# Altium footprint library 6-Connectors-2.PcbLib: 57 footprints (part 5 of 7) (continued)
## HARTING_09 03 796 6850 [mm] "DIN 41612, Type C, Thru-Hole Press-in Terminations; Rows a+b+c, 96 Position, Performance level 2, Lead 4.5mm, Pitch 2.54mm, Straight Female Backplane Connector With Coding"
height 11.6
pads (98):
  round 1.7 hole 1: a1(0,0) a2(0,-2.54) a3(0,-5.08) a4(0,-7.62) a5(0,-10.16) a6(0,-12.7) a7(0,-15.24) a8(0,-17.78) a9(0,-20.32) a10(0,-22.86) a11(0,-25.4) a12(0,-27.94) a13(0,-30.48) a14(0,-33.02) a15(0,-35.56) a16(0,-38.1) a17(0,-40.64) a18(0,-43.18) a19(0,-45.72) a20(0,-48.26) a21(0,-50.8) a22(0,-53.34) a23(0,-55.88) a24(0,-58.42) a25(0,-60.96) a26(0,-63.5) a27(0,-66.04) a28(0,-68.58) a29(0,-71.12) a30(0,-73.66) a31(0,-76.2) a32(0,-78.74) b1(2.54,0) b2(2.54,-2.54) b3(2.54,-5.08) b4(2.54,-7.62) b5(2.54,-10.16) b6(2.54,-12.7) b7(2.54,-15.24) b8(2.54,-17.78) b9(2.54,-20.32) b10(2.54,-22.86) b11(2.54,-25.4) b12(2.54,-27.94) b13(2.54,-30.48) b14(2.54,-33.02) b15(2.54,-35.56) b16(2.54,-38.1) b17(2.54,-40.64) b18(2.54,-43.18) b19(2.54,-45.72) b20(2.54,-48.26) b21(2.54,-50.8) b22(2.54,-53.34) b23(2.54,-55.88) b24(2.54,-58.42) b25(2.54,-60.96) b26(2.54,-63.5) b27(2.54,-66.04) b28(2.54,-68.58) b29(2.54,-71.12) b30(2.54,-73.66) b31(2.54,-76.2) b32(2.54,-78.74) c1(5.08,0) c2(5.08,-2.54) c3(5.08,-5.08) c4(5.08,-7.62) c5(5.08,-10.16) c6(5.08,-12.7) c7(5.08,-15.24) c8(5.08,-17.78) c9(5.08,-20.32) c10(5.08,-22.86) c11(5.08,-25.4) c12(5.08,-27.94) c13(5.08,-30.48) c14(5.08,-33.02) c15(5.08,-35.56) c16(5.08,-38.1) c17(5.08,-40.64) c18(5.08,-43.18) c19(5.08,-45.72) c20(5.08,-48.26) c21(5.08,-50.8) c22(5.08,-53.34) c23(5.08,-55.88) c24(5.08,-58.42) c25(5.08,-60.96) c26(5.08,-63.5) c27(5.08,-66.04) c28(5.08,-68.58) c29(5.08,-71.12) c30(5.08,-73.66) c31(5.08,-76.2) c32(5.08,-78.74)
  round 3.5 / inner round 3.5 / far side round 5.1 hole 2.8: MTG1(2.24,5.63) MTG2(2.24,-84.37)
Top Overlay:
  drawing of 160 lines, arcs and shapes, not listed
  text "a" at -1.951,3.96 h1.2
  text "c" at 5.305,2.935 h1.2
  text "10" at -5.475,-23.46 h1.2
  text "32" at -5.675,-79.365 h1.2
  text "5" at -4.55,-10.835 h1.2
  text "30" at -5.675,-74.285 h1.2
  text "25" at -5.675,-61.585 h1.2
  text "20" at -5.675,-48.885 h1.2
  text "15" at -5.475,-36.135 h1.2
  text "1" at -4.075,-0.675 h1.2
Mechanical 8:
  drawing of 396 lines, arcs and shapes, not listed
Mechanical 14:
  drawing of 1310 lines, arcs and shapes, not listed
  text "a" at -1.951,3.96 h1.2
  text "c" at 5.305,2.935 h1.2
  text "10" at -5.475,-23.46 h1.2
  text "32" at -5.675,-79.365 h1.2
  text "5" at -4.55,-10.835 h1.2
  text "30" at -5.675,-74.285 h1.2
  text "25" at -5.675,-61.585 h1.2
  text "20" at -5.675,-48.885 h1.2
  text "15" at -5.475,-36.135 h1.2
  text "1" at -4.075,-0.675 h1.2
Drill Drawing:
  lines w0.1: -2.54,-58.42 -2.54,-81.28 7.62,-81.28 7.62,2.54 -2.54,2.54 -2.54,-20.32
  text "PRESS-FIT TECHNOLOGY diam. 1mm +0.1 -0" at -1.905,-56.515 h1
3D body "HARTING_09 03 796 6850.stp": height 11.6, standoff -4.5, extent -2.71,-86.82 9.99,8.08

## HARTING_09 04 132 2921 [mm] "Eurocard DIN 41612, Type D, 32 Position, Rows a+c, Performance level 1, Male, Lead 3.0 mm, Pitch 5.08 mm"
height 11
pads (34):
  round 1.7 hole 1: a2(0,0) a4(0,-5.08) a6(0,-10.16) a8(0,-15.24) a10(0,-20.32) a12(0,-25.4) a14(0,-30.48) a16(0,-35.56) a18(0,-40.64) a20(0,-45.72) a22(0,-50.8) a24(0,-55.88) a26(0,-60.96) a28(0,-66.04) a30(0,-71.12) a32(0,-76.2) c2(-5.08,0) c4(-5.08,-5.08) c6(-5.08,-10.16) c8(-5.08,-15.24) c10(-5.08,-20.32) c12(-5.08,-25.4) c14(-5.08,-30.48) c16(-5.08,-35.56) c18(-5.08,-40.64) c20(-5.08,-45.72) c22(-5.08,-50.8) c24(-5.08,-55.88) c26(-5.08,-60.96) c28(-5.08,-66.04) c30(-5.08,-71.12) c32(-5.08,-76.2)
  round 3.5 / inner round 3.5 / far side round 5.1 hole 2.8: MTG1(2.54,7.62) MTG2(2.54,-81.28)
Top Overlay:
  lines w0.2: 1.65,-83.78 -0.31,-83.78 -0.31,-78.28 2.04,-78.28 ; 1.65,10.12 -0.31,10.12 -0.31,4.62 2.04,4.62 ; 2.04,-75.05 4.84,-75.05 ccw(c4.84,-74.85) 5.04,-74.85 5.04,-72.83 ccw(c4.84,-72.83) 4.84,-72.63 2.04,-72.63 ; 2.04,-71.43 4.84,-71.43 ccw(c4.84,-71.23) 5.04,-71.23 5.04,-67.63 ccw(c4.84,-67.63) 4.84,-67.43 2.04,-67.43 ; 2.04,-66.23 4.84,-66.23 ccw(c4.84,-66.03) 5.04,-66.03 5.04,-61.63 ccw(c4.84,-61.63) 4.84,-61.43 2.04,-61.43 ; 2.04,-60.23 4.84,-60.23 ccw(c4.84,-60.03) 5.04,-60.03 5.04,-55.63 ccw(c4.84,-55.63) 4.84,-55.43 2.04,-55.43 ; 2.04,-54.23 4.84,-54.23 ccw(c4.84,-54.03) 5.04,-54.03 5.04,-49.63 ccw(c4.84,-49.63) 4.84,-49.43 2.04,-49.43 ; 2.04,-48.23 4.84,-48.23 ccw(c4.84,-48.03) 5.04,-48.03 5.04,-43.63 ccw(c4.84,-43.63) 4.84,-43.43 2.04,-43.43 ; 2.04,-42.23 4.84,-42.23 ccw(c4.84,-42.03) 5.04,-42.03 5.04,-37.63 ccw(c4.84,-37.63) 4.84,-37.43 2.04,-37.43 ; 2.04,-36.23 4.84,-36.23 ccw(c4.84,-36.03) 5.04,-36.03 5.04,-31.63 ccw(c4.84,-31.63) 4.84,-31.43 2.04,-31.43 ; 2.04,-30.23 4.84,-30.23 ccw(c4.84,-30.03) 5.04,-30.03 5.04,-25.63 ccw(c4.84,-25.63) 4.84,-25.43 2.04,-25.43 ; 2.04,-24.23 4.84,-24.23 ccw(c4.84,-24.03) 5.04,-24.03 5.04,-19.63 ccw(c4.84,-19.63) 4.84,-19.43 2.04,-19.43 ; 2.04,-18.23 4.84,-18.23 ccw(c4.84,-18.03) 5.04,-18.03 5.04,-13.63 ccw(c4.84,-13.63) 4.84,-13.43 2.04,-13.43 ; 2.04,-12.23 4.84,-12.23 ccw(c4.84,-12.03) 5.04,-12.03 5.04,-7.63 ccw(c4.84,-7.63) 4.84,-7.43 2.04,-7.43 ; 2.04,-6.23 4.84,-6.23 ccw(c4.84,-6.03) 5.04,-6.03 5.04,-2.43 ccw(c4.84,-2.43) 4.84,-2.23 2.04,-2.23 ; 2.04,-1.03 4.84,-1.03 ccw(c4.84,-0.83) 5.04,-0.83 5.04,1.19 ccw(c4.84,1.19) 4.84,1.39 2.04,1.39 ; 2.04,3.69 4.84,3.69 ccw(c4.84,3.89) 5.04,3.89 5.04,6.75 ; 3.275,-83.78 7.74,-83.78 7.74,-80.53 ; 3.275,10.12 7.74,10.12 7.74,6.87 ; 2.04,-77.35 2.04,4.77 3.897,4.77 5.04,6.75 ; 2.04,-77.35 2.04,-77.55 2.04,-78.43 3.897,-78.43 5.04,-80.41 ; 2.04,-77.35 4.84,-77.35 cw(c4.84,-77.55) 5.04,-77.55 5.04,-80.41 ; 5.04,-80.41 5.109,-80.53 12.64,-80.53 12.64,6.87 5.109,6.87 5.04,6.75
  text "2" at -8.57,-0.675 h1.2
  text "4" at -8.57,-5.755 h1.2
  text "6" at -8.57,-10.835 h1.2
  text "8" at -8.57,-15.915 h1.2
  text "12" at -8.57,-26.075 h1.2
  text "14" at -8.57,-31.155 h1.2
  text "16" at -8.57,-36.235 h1.2
  text "18" at -8.57,-41.315 h1.2
  text "22" at -8.57,-51.475 h1.2
  text "24" at -8.57,-56.555 h1.2
  text "26" at -8.57,-61.635 h1.2
  text "c" at -4.445,1.905 h1.2
  text "a" at 0.635,1.905 h1.2
  text "32" at -8.57,-76.875 h1.2
  text "10" at -8.57,-20.995 h1.2
  text "20" at -8.57,-46.395 h1.2
  text "28" at -8.57,-66.715 h1.2
  text "30" at -8.57,-71.795 h1.2
Mechanical 8:
  lines w0.1: 5.3,-76.2 5.3,-40.475 ; 5.3,-35.725 5.3,0
  text "PCB" at 6.05,-40.1 h1.2
Mechanical 14:
  lines w0.1: 2.04,-78.28 -0.31,-78.28 -0.31,-83.78 7.74,-83.78 7.74,-80.53 ; 2.04,-75.05 4.84,-75.05 ccw(c4.84,-74.85) 5.04,-74.85 5.04,-72.83 ccw(c4.84,-72.83) 4.84,-72.63 2.04,-72.63 ; 2.04,-71.43 4.84,-71.43 ccw(c4.84,-71.23) 5.04,-71.23 5.04,-67.63 ccw(c4.84,-67.63) 4.84,-67.43 2.04,-67.43 ; 2.04,-66.23 4.84,-66.23 ccw(c4.84,-66.03) 5.04,-66.03 5.04,-61.63 ccw(c4.84,-61.63) 4.84,-61.43 2.04,-61.43 ; 2.04,-60.23 4.84,-60.23 ccw(c4.84,-60.03) 5.04,-60.03 5.04,-55.63 ccw(c4.84,-55.63) 4.84,-55.43 2.04,-55.43 ; 2.04,-54.23 4.84,-54.23 ccw(c4.84,-54.03) 5.04,-54.03 5.04,-49.63 ccw(c4.84,-49.63) 4.84,-49.43 2.04,-49.43 ; 2.04,-48.23 4.84,-48.23 ccw(c4.84,-48.03) 5.04,-48.03 5.04,-43.63 ccw(c4.84,-43.63) 4.84,-43.43 2.04,-43.43 ; 2.04,-42.23 4.84,-42.23 ccw(c4.84,-42.03) 5.04,-42.03 5.04,-37.63 ccw(c4.84,-37.63) 4.84,-37.43 2.04,-37.43 ; 2.04,-36.23 4.84,-36.23 ccw(c4.84,-36.03) 5.04,-36.03 5.04,-31.63 ccw(c4.84,-31.63) 4.84,-31.43 2.04,-31.43 ; 2.04,-30.23 4.84,-30.23 ccw(c4.84,-30.03) 5.04,-30.03 5.04,-25.63 ccw(c4.84,-25.63) 4.84,-25.43 2.04,-25.43 ; 2.04,-24.23 4.84,-24.23 ccw(c4.84,-24.03) 5.04,-24.03 5.04,-19.63 ccw(c4.84,-19.63) 4.84,-19.43 2.04,-19.43 ; 2.04,-18.23 4.84,-18.23 ccw(c4.84,-18.03) 5.04,-18.03 5.04,-13.63 ccw(c4.84,-13.63) 4.84,-13.43 2.04,-13.43 ; 2.04,-12.23 4.84,-12.23 ccw(c4.84,-12.03) 5.04,-12.03 5.04,-7.63 ccw(c4.84,-7.63) 4.84,-7.43 2.04,-7.43 ; 2.04,-6.23 4.84,-6.23 ccw(c4.84,-6.03) 5.04,-6.03 5.04,-2.43 ccw(c4.84,-2.43) 4.84,-2.23 2.04,-2.23 ; 2.04,-1.03 4.84,-1.03 ccw(c4.84,-0.83) 5.04,-0.83 5.04,1.19 ccw(c4.84,1.19) 4.84,1.39 2.04,1.39 ; 2.04,3.69 4.84,3.69 ccw(c4.84,3.89) 5.04,3.89 5.04,6.75 ; 2.04,4.62 -0.31,4.62 -0.31,10.12 7.74,10.12 7.74,6.87 ; 2.04,-77.35 4.84,-77.35 cw(c4.84,-77.55) 5.04,-77.55 5.04,-80.41 ; 2.04,-77.35 2.04,-77.55 2.04,-78.43 3.897,-78.43 5.04,-80.41 ; 2.04,-77.35 2.04,4.77 3.897,4.77 5.04,6.75 ; 5.04,-80.41 5.109,-80.53 12.64,-80.53 12.64,6.87 5.109,6.87 5.04,6.75
  text "a" at 0.635,1.905 h1.2
  text "c" at -4.445,1.905 h1.2
  text "30" at -8.57,-71.795 h1.2
  text "28" at -8.57,-66.715 h1.2
  text "20" at -8.57,-46.395 h1.2
  text "10" at -8.57,-20.995 h1.2
  text "32" at -8.57,-76.875 h1.2
  text "26" at -8.57,-61.635 h1.2
  text "24" at -8.57,-56.555 h1.2
  text "22" at -8.57,-51.475 h1.2
  text "18" at -8.57,-41.315 h1.2
  text "16" at -8.57,-36.235 h1.2
  text "14" at -8.57,-31.155 h1.2
  text "12" at -8.57,-26.075 h1.2
  text "8" at -8.57,-15.915 h1.2
  text "6" at -8.57,-10.835 h1.2
  text "4" at -8.57,-5.755 h1.2
  text "2" at -8.57,-0.675 h1.2
3D body "v160-080.stp": height 0.02, standoff -1.65, extent -5.88,-77 -4.28,-75.4
3D body "v160-080.stp": height 0.02, standoff -1.65, extent -0.8,-77 0.8,-75.4
3D body "v160-080.stp": height 0.02, standoff -1.65, extent -0.8,-71.92 0.8,-70.32
3D body "v160-080.stp": height 0.02, standoff -1.65, extent -0.8,-66.84 0.8,-65.24
3D body "v160-080.stp": height 0.02, standoff -1.65, extent -0.8,-61.76 0.8,-60.16
3D body "v160-080.stp": height 0.02, standoff -1.65, extent -5.88,-71.92 -4.28,-70.32
3D body "v160-080.stp": height 0.02, standoff -1.65, extent -5.88,-66.84 -4.28,-65.24
3D body "v160-080.stp": height 0.02, standoff -1.65, extent -5.88,-61.76 -4.28,-60.16
3D body "v160-080.stp": height 0.02, standoff -1.65, extent -0.8,-56.68 0.8,-55.08
3D body "v160-080.stp": height 0.02, standoff -1.65, extent -0.8,-51.6 0.8,-50
3D body "v160-080.stp": height 0.02, standoff -1.65, extent -0.8,-46.52 0.8,-44.92
3D body "v160-080.stp": height 0.02, standoff -1.65, extent -5.88,-56.68 -4.28,-55.08
3D body "v160-080.stp": height 0.02, standoff -1.65, extent -5.88,-51.6 -4.28,-50
3D body "v160-080.stp": height 0.02, standoff -1.65, extent -5.88,-46.52 -4.28,-44.92
3D body "v160-080.stp": height 0.02, standoff -1.65, extent -0.8,-41.44 0.8,-39.84
3D body "v160-080.stp": height 0.02, standoff -1.65, extent -0.8,-36.36 0.8,-34.76
3D body "v160-080.stp": height 0.02, standoff -1.65, extent -0.8,-31.28 0.8,-29.68
3D body "v160-080.stp": height 0.02, standoff -1.65, extent -5.88,-41.44 -4.28,-39.84
3D body "v160-080.stp": height 0.02, standoff -1.65, extent -5.88,-36.36 -4.28,-34.76
3D body "v160-080.stp": height 0.02, standoff -1.65, extent -5.88,-31.28 -4.28,-29.68
3D body "v160-080.stp": height 0.02, standoff -1.65, extent -0.8,-26.2 0.8,-24.6
3D body "v160-080.stp": height 0.02, standoff -1.65, extent -0.8,-21.12 0.8,-19.52
3D body "v160-080.stp": height 0.02, standoff -1.65, extent -0.8,-16.04 0.8,-14.44
3D body "v160-080.stp": height 0.02, standoff -1.65, extent -5.88,-26.2 -4.28,-24.6
3D body "v160-080.stp": height 0.02, standoff -1.65, extent -5.88,-21.12 -4.28,-19.52
3D body "v160-080.stp": height 0.02, standoff -1.65, extent -5.88,-16.04 -4.28,-14.44
3D body "v160-080.stp": height 0.02, standoff -1.65, extent -0.8,-10.96 0.8,-9.36
3D body "v160-080.stp": height 0.02, standoff -1.65, extent -0.8,-5.88 0.8,-4.28
3D body "v160-080.stp": height 0.02, standoff -1.65, extent -0.8,-0.8 0.8,0.8
3D body "v160-080.stp": height 0.02, standoff -1.65, extent -5.88,-10.96 -4.28,-9.36
3D body "v160-080.stp": height 0.02, standoff -1.65, extent -5.88,-5.88 -4.28,-4.28
3D body "v160-080.stp": height 0.02, standoff -1.65, extent -5.88,-0.8 -4.28,0.8
3D body "HARTING_09 04 132 2921.stp": height 9.4, standoff -3, extent -5.38,-83.83 12.64,10.17

## HARTING_09 04 132 6921 [mm] "Eurocard DIN 41612, Type D, 32 Position, Rows a+c, Performance level 2, Male, Lead 3.0 mm, Pitch 5.08 mm"
height 11
pads (34):
  round 1.7 hole 1: a2(0,0) a4(0,-5.08) a6(0,-10.16) a8(0,-15.24) a10(0,-20.32) a12(0,-25.4) a14(0,-30.48) a16(0,-35.56) a18(0,-40.64) a20(0,-45.72) a22(0,-50.8) a24(0,-55.88) a26(0,-60.96) a28(0,-66.04) a30(0,-71.12) a32(0,-76.2) c2(-5.08,0) c4(-5.08,-5.08) c6(-5.08,-10.16) c8(-5.08,-15.24) c10(-5.08,-20.32) c12(-5.08,-25.4) c14(-5.08,-30.48) c16(-5.08,-35.56) c18(-5.08,-40.64) c20(-5.08,-45.72) c22(-5.08,-50.8) c24(-5.08,-55.88) c26(-5.08,-60.96) c28(-5.08,-66.04) c30(-5.08,-71.12) c32(-5.08,-76.2)
  round 3.5 / inner round 3.5 / far side round 5.1 hole 2.8: MTG1(2.54,7.62) MTG2(2.54,-81.28)
Top Overlay:
  lines w0.2: 1.65,-83.78 -0.31,-83.78 -0.31,-78.28 2.04,-78.28 ; 1.65,10.12 -0.31,10.12 -0.31,4.62 2.04,4.62 ; 2.04,-75.05 4.84,-75.05 ccw(c4.84,-74.85) 5.04,-74.85 5.04,-72.83 ccw(c4.84,-72.83) 4.84,-72.63 2.04,-72.63 ; 2.04,-71.43 4.84,-71.43 ccw(c4.84,-71.23) 5.04,-71.23 5.04,-67.63 ccw(c4.84,-67.63) 4.84,-67.43 2.04,-67.43 ; 2.04,-66.23 4.84,-66.23 ccw(c4.84,-66.03) 5.04,-66.03 5.04,-61.63 ccw(c4.84,-61.63) 4.84,-61.43 2.04,-61.43 ; 2.04,-60.23 4.84,-60.23 ccw(c4.84,-60.03) 5.04,-60.03 5.04,-55.63 ccw(c4.84,-55.63) 4.84,-55.43 2.04,-55.43 ; 2.04,-54.23 4.84,-54.23 ccw(c4.84,-54.03) 5.04,-54.03 5.04,-49.63 ccw(c4.84,-49.63) 4.84,-49.43 2.04,-49.43 ; 2.04,-48.23 4.84,-48.23 ccw(c4.84,-48.03) 5.04,-48.03 5.04,-43.63 ccw(c4.84,-43.63) 4.84,-43.43 2.04,-43.43 ; 2.04,-42.23 4.84,-42.23 ccw(c4.84,-42.03) 5.04,-42.03 5.04,-37.63 ccw(c4.84,-37.63) 4.84,-37.43 2.04,-37.43 ; 2.04,-36.23 4.84,-36.23 ccw(c4.84,-36.03) 5.04,-36.03 5.04,-31.63 ccw(c4.84,-31.63) 4.84,-31.43 2.04,-31.43 ; 2.04,-30.23 4.84,-30.23 ccw(c4.84,-30.03) 5.04,-30.03 5.04,-25.63 ccw(c4.84,-25.63) 4.84,-25.43 2.04,-25.43 ; 2.04,-24.23 4.84,-24.23 ccw(c4.84,-24.03) 5.04,-24.03 5.04,-19.63 ccw(c4.84,-19.63) 4.84,-19.43 2.04,-19.43 ; 2.04,-18.23 4.84,-18.23 ccw(c4.84,-18.03) 5.04,-18.03 5.04,-13.63 ccw(c4.84,-13.63) 4.84,-13.43 2.04,-13.43 ; 2.04,-12.23 4.84,-12.23 ccw(c4.84,-12.03) 5.04,-12.03 5.04,-7.63 ccw(c4.84,-7.63) 4.84,-7.43 2.04,-7.43 ; 2.04,-6.23 4.84,-6.23 ccw(c4.84,-6.03) 5.04,-6.03 5.04,-2.43 ccw(c4.84,-2.43) 4.84,-2.23 2.04,-2.23 ; 2.04,-1.03 4.84,-1.03 ccw(c4.84,-0.83) 5.04,-0.83 5.04,1.19 ccw(c4.84,1.19) 4.84,1.39 2.04,1.39 ; 2.04,3.69 4.84,3.69 ccw(c4.84,3.89) 5.04,3.89 5.04,6.75 ; 3.275,-83.78 7.74,-83.78 7.74,-80.53 ; 3.275,10.12 7.74,10.12 7.74,6.87 ; 2.04,-77.35 4.84,-77.35 cw(c4.84,-77.55) 5.04,-77.55 5.04,-80.41 ; 2.04,-77.35 2.04,-77.55 2.04,-78.43 3.897,-78.43 5.04,-80.41 ; 2.04,-77.35 2.04,4.77 3.897,4.77 5.04,6.75 ; 5.04,-80.41 5.109,-80.53 12.64,-80.53 12.64,6.87 5.109,6.87 5.04,6.75
  text "2" at -8.57,-0.675 h1.2
  text "4" at -8.57,-5.755 h1.2
  text "6" at -8.57,-10.835 h1.2
  text "8" at -8.57,-15.915 h1.2
  text "12" at -8.57,-26.075 h1.2
  text "14" at -8.57,-31.155 h1.2
  text "16" at -8.57,-36.235 h1.2
  text "18" at -8.57,-41.315 h1.2
  text "22" at -8.57,-51.475 h1.2
  text "24" at -8.57,-56.555 h1.2
  text "26" at -8.57,-61.635 h1.2
  text "c" at -4.445,1.905 h1.2
  text "a" at 0.635,1.905 h1.2
  text "32" at -8.57,-76.875 h1.2
  text "10" at -8.57,-20.995 h1.2
  text "20" at -8.57,-46.395 h1.2
  text "28" at -8.57,-66.715 h1.2
  text "30" at -8.57,-71.795 h1.2
Mechanical 8:
  lines w0.1: 5.3,-76.2 5.3,-40.475 ; 5.3,-35.725 5.3,0
  text "PCB" at 6.05,-40.1 h1.2
Mechanical 14:
  lines w0.1: 2.04,-78.28 -0.31,-78.28 -0.31,-83.78 7.74,-83.78 7.74,-80.53 ; 2.04,-75.05 4.84,-75.05 ccw(c4.84,-74.85) 5.04,-74.85 5.04,-72.83 ccw(c4.84,-72.83) 4.84,-72.63 2.04,-72.63 ; 2.04,-71.43 4.84,-71.43 ccw(c4.84,-71.23) 5.04,-71.23 5.04,-67.63 ccw(c4.84,-67.63) 4.84,-67.43 2.04,-67.43 ; 2.04,-66.23 4.84,-66.23 ccw(c4.84,-66.03) 5.04,-66.03 5.04,-61.63 ccw(c4.84,-61.63) 4.84,-61.43 2.04,-61.43 ; 2.04,-60.23 4.84,-60.23 ccw(c4.84,-60.03) 5.04,-60.03 5.04,-55.63 ccw(c4.84,-55.63) 4.84,-55.43 2.04,-55.43 ; 2.04,-54.23 4.84,-54.23 ccw(c4.84,-54.03) 5.04,-54.03 5.04,-49.63 ccw(c4.84,-49.63) 4.84,-49.43 2.04,-49.43 ; 2.04,-48.23 4.84,-48.23 ccw(c4.84,-48.03) 5.04,-48.03 5.04,-43.63 ccw(c4.84,-43.63) 4.84,-43.43 2.04,-43.43 ; 2.04,-42.23 4.84,-42.23 ccw(c4.84,-42.03) 5.04,-42.03 5.04,-37.63 ccw(c4.84,-37.63) 4.84,-37.43 2.04,-37.43 ; 2.04,-36.23 4.84,-36.23 ccw(c4.84,-36.03) 5.04,-36.03 5.04,-31.63 ccw(c4.84,-31.63) 4.84,-31.43 2.04,-31.43 ; 2.04,-30.23 4.84,-30.23 ccw(c4.84,-30.03) 5.04,-30.03 5.04,-25.63 ccw(c4.84,-25.63) 4.84,-25.43 2.04,-25.43 ; 2.04,-24.23 4.84,-24.23 ccw(c4.84,-24.03) 5.04,-24.03 5.04,-19.63 ccw(c4.84,-19.63) 4.84,-19.43 2.04,-19.43 ; 2.04,-18.23 4.84,-18.23 ccw(c4.84,-18.03) 5.04,-18.03 5.04,-13.63 ccw(c4.84,-13.63) 4.84,-13.43 2.04,-13.43 ; 2.04,-12.23 4.84,-12.23 ccw(c4.84,-12.03) 5.04,-12.03 5.04,-7.63 ccw(c4.84,-7.63) 4.84,-7.43 2.04,-7.43 ; 2.04,-6.23 4.84,-6.23 ccw(c4.84,-6.03) 5.04,-6.03 5.04,-2.43 ccw(c4.84,-2.43) 4.84,-2.23 2.04,-2.23 ; 2.04,-1.03 4.84,-1.03 ccw(c4.84,-0.83) 5.04,-0.83 5.04,1.19 ccw(c4.84,1.19) 4.84,1.39 2.04,1.39 ; 2.04,3.69 4.84,3.69 ccw(c4.84,3.89) 5.04,3.89 5.04,6.75 ; 2.04,4.62 -0.31,4.62 -0.31,10.12 7.74,10.12 7.74,6.87 ; 2.04,-77.35 2.04,4.77 3.897,4.77 5.04,6.75 ; 2.04,-77.35 2.04,-77.55 2.04,-78.43 3.897,-78.43 5.04,-80.41 ; 2.04,-77.35 4.84,-77.35 cw(c4.84,-77.55) 5.04,-77.55 5.04,-80.41 ; 5.04,-80.41 5.109,-80.53 12.64,-80.53 12.64,6.87 5.109,6.87 5.04,6.75
  text "a" at 0.635,1.905 h1.2
  text "c" at -4.445,1.905 h1.2
  text "30" at -8.57,-71.795 h1.2
  text "28" at -8.57,-66.715 h1.2
  text "20" at -8.57,-46.395 h1.2
  text "10" at -8.57,-20.995 h1.2
  text "32" at -8.57,-76.875 h1.2
  text "26" at -8.57,-61.635 h1.2
  text "24" at -8.57,-56.555 h1.2
  text "22" at -8.57,-51.475 h1.2
  text "18" at -8.57,-41.315 h1.2
  text "16" at -8.57,-36.235 h1.2
  text "14" at -8.57,-31.155 h1.2
  text "12" at -8.57,-26.075 h1.2
  text "8" at -8.57,-15.915 h1.2
  text "6" at -8.57,-10.835 h1.2
  text "4" at -8.57,-5.755 h1.2
  text "2" at -8.57,-0.675 h1.2
3D body "v160-080.stp": height 0.02, standoff -1.65, extent -5.88,-77 -4.28,-75.4
3D body "v160-080.stp": height 0.02, standoff -1.65, extent -0.8,-77 0.8,-75.4
3D body "v160-080.stp": height 0.02, standoff -1.65, extent -5.88,-71.92 -4.28,-70.32
3D body "v160-080.stp": height 0.02, standoff -1.65, extent -5.88,-66.84 -4.28,-65.24
3D body "v160-080.stp": height 0.02, standoff -1.65, extent -5.88,-61.76 -4.28,-60.16
3D body "v160-080.stp": height 0.02, standoff -1.65, extent -0.8,-71.92 0.8,-70.32
3D body "v160-080.stp": height 0.02, standoff -1.65, extent -0.8,-66.84 0.8,-65.24
3D body "v160-080.stp": height 0.02, standoff -1.65, extent -0.8,-61.76 0.8,-60.16
3D body "v160-080.stp": height 0.02, standoff -1.65, extent -5.88,-56.68 -4.28,-55.08
3D body "v160-080.stp": height 0.02, standoff -1.65, extent -5.88,-51.6 -4.28,-50
3D body "v160-080.stp": height 0.02, standoff -1.65, extent -5.88,-46.52 -4.28,-44.92
3D body "v160-080.stp": height 0.02, standoff -1.65, extent -0.8,-56.68 0.8,-55.08
3D body "v160-080.stp": height 0.02, standoff -1.65, extent -0.8,-51.6 0.8,-50
3D body "v160-080.stp": height 0.02, standoff -1.65, extent -0.8,-46.52 0.8,-44.92
3D body "v160-080.stp": height 0.02, standoff -1.65, extent -5.88,-41.44 -4.28,-39.84
3D body "v160-080.stp": height 0.02, standoff -1.65, extent -5.88,-36.36 -4.28,-34.76
3D body "v160-080.stp": height 0.02, standoff -1.65, extent -5.88,-31.28 -4.28,-29.68
3D body "v160-080.stp": height 0.02, standoff -1.65, extent -0.8,-41.44 0.8,-39.84
3D body "v160-080.stp": height 0.02, standoff -1.65, extent -0.8,-36.36 0.8,-34.76
3D body "v160-080.stp": height 0.02, standoff -1.65, extent -0.8,-31.28 0.8,-29.68
3D body "v160-080.stp": height 0.02, standoff -1.65, extent -5.88,-26.2 -4.28,-24.6
3D body "v160-080.stp": height 0.02, standoff -1.65, extent -5.88,-21.12 -4.28,-19.52
3D body "v160-080.stp": height 0.02, standoff -1.65, extent -5.88,-16.04 -4.28,-14.44
3D body "v160-080.stp": height 0.02, standoff -1.65, extent -0.8,-26.2 0.8,-24.6
3D body "v160-080.stp": height 0.02, standoff -1.65, extent -0.8,-21.12 0.8,-19.52
3D body "v160-080.stp": height 0.02, standoff -1.65, extent -0.8,-16.04 0.8,-14.44
3D body "v160-080.stp": height 0.02, standoff -1.65, extent -0.8,-10.96 0.8,-9.36
3D body "v160-080.stp": height 0.02, standoff -1.65, extent -0.8,-5.88 0.8,-4.28
3D body "v160-080.stp": height 0.02, standoff -1.65, extent -0.8,-0.8 0.8,0.8
3D body "v160-080.stp": height 0.02, standoff -1.65, extent -5.88,-10.96 -4.28,-9.36
3D body "v160-080.stp": height 0.02, standoff -1.65, extent -5.88,-5.88 -4.28,-4.28
3D body "v160-080.stp": height 0.02, standoff -1.65, extent -5.88,-0.8 -4.28,0.8
3D body "HARTING_09 04 132 6921.stp": height 9.4, standoff -3, extent -5.38,-83.83 12.64,10.17

## HARTING_09 04 232 6831 [mm] "DIN 41612, Type D, Thru-Hole; Rows a+c, 32 Position, Straight Female Backplane Connector"
height 11.6
pads (34):
  round 1.7 hole 1: a2(0,-2.54) a4(0,-7.62) a6(0,-12.7) a8(0,-17.78) a10(0,-22.86) a12(0,-27.94) a14(0,-33.02) a16(0,-38.1) a18(0,-43.18) a20(0,-48.26) a22(0,-53.34) a24(0,-58.42) a26(0,-63.5) a28(0,-68.58) a30(0,-73.66) a32(0,-78.74) c2(5.08,-2.54) c4(5.08,-7.62) c6(5.08,-12.7) c8(5.08,-17.78) c10(5.08,-22.86) c12(5.08,-27.94) c14(5.08,-33.02) c16(5.08,-38.1) c18(5.08,-43.18) c20(5.08,-48.26) c22(5.08,-53.34) c24(5.08,-58.42) c26(5.08,-63.5) c28(5.08,-68.58) c30(5.08,-73.66) c32(5.08,-78.74)
  round 3.5 / inner round 3.5 / far side round 5.1 hole 2.8: MTG1(2.24,5.63) MTG2(2.24,-84.37)
Top Overlay:
  lines w0.2: -2.71,-84.37 -0.735,-84.37 ; -2.71,-77.87 -1.71,-77.87 ; -2.71,-0.87 -1.71,-0.87 ; -2.71,5.63 -0.735,5.63 ; -1.06,-79.95 -1.06,-81.22 ; -1.06,-1.2 -1.06,2.48 ; -0.735,-86.82 -0.735,-84.37 ; -0.735,8.08 -0.735,5.63 ; 1,-86.82 -2.71,-86.82 -2.71,8.08 1,8.08 ; 3.556,-86.82 7.79,-86.82 7.79,8.08 3.556,8.08 ; 5.215,-86.82 5.215,-84.37 ; 5.215,8.08 5.215,5.63 ; 6.14,-79.75 6.14,-80.19 ; 6.14,-1.1 6.14,1.45 ; 6.79,-77.87 7.79,-77.87 ; 6.79,-0.87 7.79,-0.87 ; 7.79,-84.37 5.215,-84.37 ; 7.79,5.63 5.215,5.63 ; -1.71,-81.87 -1.06,-81.22 ; -1.71,-81.87 -1.71,3.13 ; -1.71,-81.87 3.69,-81.87 ; -1.71,3.13 -1.06,2.48 ; -1.71,3.13 3.69,3.13 ; -1.06,-81.22 3.04,-81.22 ; -1.06,2.48 3.04,2.48 ; -0.735,-84.37 0.708,-81.87 3.772,-81.87 5.215,-84.37 ; -0.735,5.63 0.708,3.13 3.772,3.13 5.215,5.63 ; 3.04,-81.22 3.69,-81.87 ; 3.04,-81.22 3.04,-80.19 ; 3.04,-80.19 3.69,-80.84 ; 3.04,-80.19 6.14,-80.19 ; 3.04,1.45 6.14,1.45 ; 3.04,1.45 3.69,2.1 ; 3.04,1.45 3.04,2.48 ; 3.04,2.48 3.69,3.13 ; 3.69,-81.87 3.69,-80.84 ; 3.69,-80.84 6.79,-80.84 ; 3.69,2.1 6.79,2.1 ; 3.69,2.1 3.69,3.13 ; 6.14,-80.19 6.79,-80.84 ; 6.14,1.45 6.79,2.1 ; 6.79,-80.84 6.79,2.1
  text "1" at -4.075,-0.675 h1.2
  text "15" at -5.475,-36.135 h1.2
  text "20" at -5.675,-48.885 h1.2
  text "25" at -5.675,-61.585 h1.2
  text "30" at -5.675,-74.285 h1.2
  text "5" at -4.55,-10.835 h1.2
  text "32" at -5.675,-79.365 h1.2
  text "10" at -5.475,-23.46 h1.2
  text "c" at 5.305,2.935 h1.2
  text "a" at -1.951,3.96 h1.2
Mechanical 8:
  lines w0.1: -1,-78.74 0,-78.74 ; -1,-73.66 0,-73.66 ; -1,-68.58 0,-68.58 ; -1,-63.5 0,-63.5 ; -1,-58.42 0,-58.42 ; -1,-53.34 0,-53.34 ; -1,-48.26 0,-48.26 ; -1,-43.18 0,-43.18 ; -1,-38.1 0,-38.1 ; -1,-33.02 0,-33.02 ; -1,-27.94 0,-27.94 ; -1,-22.86 0,-22.86 ; -1,-17.78 0,-17.78 ; -1,-12.7 0,-12.7 ; -1,-7.62 0,-7.62 ; -1,-2.54 0,-2.54 ; 0,-79.74 0,-78.74 ; 0,-77.74 0,-78.74 ; 0,-74.66 0,-73.66 ; 0,-72.66 0,-73.66 ; 0,-69.58 0,-68.58 ; 0,-67.58 0,-68.58 ; 0,-64.5 0,-63.5 ; 0,-62.5 0,-63.5 ; 0,-59.42 0,-58.42 ; 0,-57.42 0,-58.42 ; 0,-54.34 0,-53.34 ; 0,-52.34 0,-53.34 ; 0,-49.26 0,-48.26 ; 0,-47.26 0,-48.26 ; 0,-44.18 0,-43.18 ; 0,-42.18 0,-43.18 ; 0,-39.1 0,-38.1 ; 0,-37.1 0,-38.1 ; 0,-34.02 0,-33.02 ; 0,-32.02 0,-33.02 ; 0,-28.94 0,-27.94 ; 0,-26.94 0,-27.94 ; 0,-23.86 0,-22.86 ; 0,-21.86 0,-22.86 ; 0,-18.78 0,-17.78 ; 0,-16.78 0,-17.78 ; 0,-13.7 0,-12.7 ; 0,-11.7 0,-12.7 ; 0,-8.62 0,-7.62 ; 0,-6.62 0,-7.62 ; 0,-3.54 0,-2.54 ; 0,-1.54 0,-2.54 ; 1,-78.74 0,-78.74 ; 1,-73.66 0,-73.66 ; 1,-68.58 0,-68.58 ; 1,-63.5 0,-63.5 ; 1,-58.42 0,-58.42 ; 1,-53.34 0,-53.34 ; 1,-48.26 0,-48.26 ; 1,-43.18 0,-43.18 ; 1,-38.1 0,-38.1 ; 1,-33.02 0,-33.02 ; 1,-27.94 0,-27.94 ; 1,-22.86 0,-22.86 ; 1,-17.78 0,-17.78 ; 1,-12.7 0,-12.7 ; 1,-7.62 0,-7.62 ; 1,-2.54 0,-2.54 ; 1.24,-84.37 2.24,-84.37 ; 1.24,5.63 2.24,5.63 ; 1.54,-39.37 2.54,-39.37 ; 2.24,-85.37 2.24,-84.37 ; 2.24,-83.37 2.24,-84.37 ; 2.24,4.63 2.24,5.63 ; 2.24,6.63 2.24,5.63 ; 2.54,-40.37 2.54,-39.37 ; 2.54,-38.37 2.54,-39.37 ; 3.24,-84.37 2.24,-84.37 ; 3.24,5.63 2.24,5.63 ; 3.54,-39.37 2.54,-39.37 ; 4.08,-78.74 5.08,-78.74 ; 4.08,-73.66 5.08,-73.66 ; 4.08,-68.58 5.08,-68.58 ; 4.08,-63.5 5.08,-63.5 ; 4.08,-58.42 5.08,-58.42 ; 4.08,-53.34 5.08,-53.34 ; 4.08,-48.26 5.08,-48.26 ; 4.08,-43.18 5.08,-43.18 ; 4.08,-38.1 5.08,-38.1 ; 4.08,-33.02 5.08,-33.02 ; 4.08,-27.94 5.08,-27.94 ; 4.08,-22.86 5.08,-22.86 ; 4.08,-17.78 5.08,-17.78 ; 4.08,-12.7 5.08,-12.7 ; 4.08,-7.62 5.08,-7.62 ; 4.08,-2.54 5.08,-2.54 ; 5.08,-79.74 5.08,-78.74 ; 5.08,-77.74 5.08,-78.74 ; 5.08,-74.66 5.08,-73.66 ; 5.08,-72.66 5.08,-73.66 ; 5.08,-69.58 5.08,-68.58 ; 5.08,-67.58 5.08,-68.58 ; 5.08,-64.5 5.08,-63.5 ; 5.08,-62.5 5.08,-63.5 ; 5.08,-59.42 5.08,-58.42 ; 5.08,-57.42 5.08,-58.42 ; 5.08,-54.34 5.08,-53.34 ; 5.08,-52.34 5.08,-53.34 ; 5.08,-49.26 5.08,-48.26 ; 5.08,-47.26 5.08,-48.26 ; 5.08,-44.18 5.08,-43.18 ; 5.08,-42.18 5.08,-43.18 ; 5.08,-39.1 5.08,-38.1 ; 5.08,-37.1 5.08,-38.1 ; 5.08,-34.02 5.08,-33.02 ; 5.08,-32.02 5.08,-33.02 ; 5.08,-28.94 5.08,-27.94 ; 5.08,-26.94 5.08,-27.94 ; 5.08,-23.86 5.08,-22.86 ; 5.08,-21.86 5.08,-22.86 ; 5.08,-18.78 5.08,-17.78 ; 5.08,-16.78 5.08,-17.78 ; 5.08,-13.7 5.08,-12.7 ; 5.08,-11.7 5.08,-12.7 ; 5.08,-8.62 5.08,-7.62 ; 5.08,-6.62 5.08,-7.62 ; 5.08,-3.54 5.08,-2.54 ; 5.08,-1.54 5.08,-2.54 ; 6.08,-78.74 5.08,-78.74 ; 6.08,-73.66 5.08,-73.66 ; 6.08,-68.58 5.08,-68.58 ; 6.08,-63.5 5.08,-63.5 ; 6.08,-58.42 5.08,-58.42 ; 6.08,-53.34 5.08,-53.34 ; 6.08,-48.26 5.08,-48.26 ; 6.08,-43.18 5.08,-43.18 ; 6.08,-38.1 5.08,-38.1 ; 6.08,-33.02 5.08,-33.02 ; 6.08,-27.94 5.08,-27.94 ; 6.08,-22.86 5.08,-22.86 ; 6.08,-17.78 5.08,-17.78 ; 6.08,-12.7 5.08,-12.7 ; 6.08,-7.62 5.08,-7.62 ; 6.08,-2.54 5.08,-2.54
Mechanical 14:
  circle w0.1: c2.24,-84.37 r1.425
  circle w0.1: c2.24,5.63 r1.425
  lines w0.1: -2.71,-84.37 -0.735,-84.37 ; -2.71,-77.87 -1.71,-77.87 ; -2.71,-0.87 -1.71,-0.87 ; -0.735,-86.82 -0.735,-84.37 ; -0.735,8.08 -0.735,5.63 0.708,3.13 3.772,3.13 5.215,5.63 ; -0.3,2.925 1.675,2.925 ; 5.215,-86.82 5.215,-84.37 ; 5.215,8.08 5.215,5.63 ; 6.79,-77.87 7.79,-77.87 ; 6.79,-0.87 7.79,-0.87 ; 7.79,-84.37 5.215,-84.37 ; 7.79,5.63 5.215,5.63 ; -1.71,-81.87 -1.06,-81.22 ; -1.71,-81.87 -1.71,3.13 ; -1.71,-81.87 3.69,-81.87 ; -1.71,3.13 -1.06,2.48 ; -1.71,3.13 3.69,3.13 ; -1.06,-81.22 -1.06,2.48 ; -1.06,-81.22 3.04,-81.22 ; -1.06,2.48 3.04,2.48 ; -0.735,-84.37 0.708,-81.87 3.772,-81.87 5.215,-84.37 ; 3.04,-81.22 3.69,-81.87 ; 3.04,-81.22 3.04,-80.19 ; 3.04,-80.19 3.69,-80.84 ; 3.04,-80.19 6.14,-80.19 ; 3.04,1.45 6.14,1.45 ; 3.04,1.45 3.69,2.1 ; 3.04,1.45 3.04,2.48 ; 3.04,2.48 3.69,3.13 ; 3.69,-81.87 3.69,-80.84 ; 3.69,-80.84 6.79,-80.84 ; 3.69,2.1 6.79,2.1 ; 3.69,2.1 3.69,3.13 ; 6.14,-80.19 6.79,-80.84 ; 6.14,-80.19 6.14,1.45 ; 6.14,1.45 6.79,2.1 ; 6.79,-80.84 6.79,2.1 ; -2.71,-86.82 -2.71,8.08 7.79,8.08 7.79,-86.82 -2.71,-86.82
  text "1" at -4.075,-0.675 h1.2
  text "15" at -5.475,-36.135 h1.2
  text "20" at -5.675,-48.885 h1.2
  text "25" at -5.675,-61.585 h1.2
  text "30" at -5.675,-74.285 h1.2
  text "5" at -4.55,-10.835 h1.2
  text "32" at -5.675,-79.365 h1.2
  text "10" at -5.475,-23.46 h1.2
  text "c" at 5.305,2.935 h1.2
  text "a" at -1.951,3.96 h1.2
3D body "HARTING_09 04 232 6831.stp": height 11.6, standoff -4.5, extent -2.71,-86.82 7.79,8.08